# Altium footprint library Sajad_Altium_Library.PcbLib: 333 footprints (part 9 of 21)
Each footprint in its own frame and in the unit in brackets; x right, y up, seen from the top. Pads: shape width x height; smd on the part's side, far side on the other; paste and mask are expansions set on the pad; w line width, h text height; cw(c..) or ccw(c..) is an arc to the next point about the centre after c.
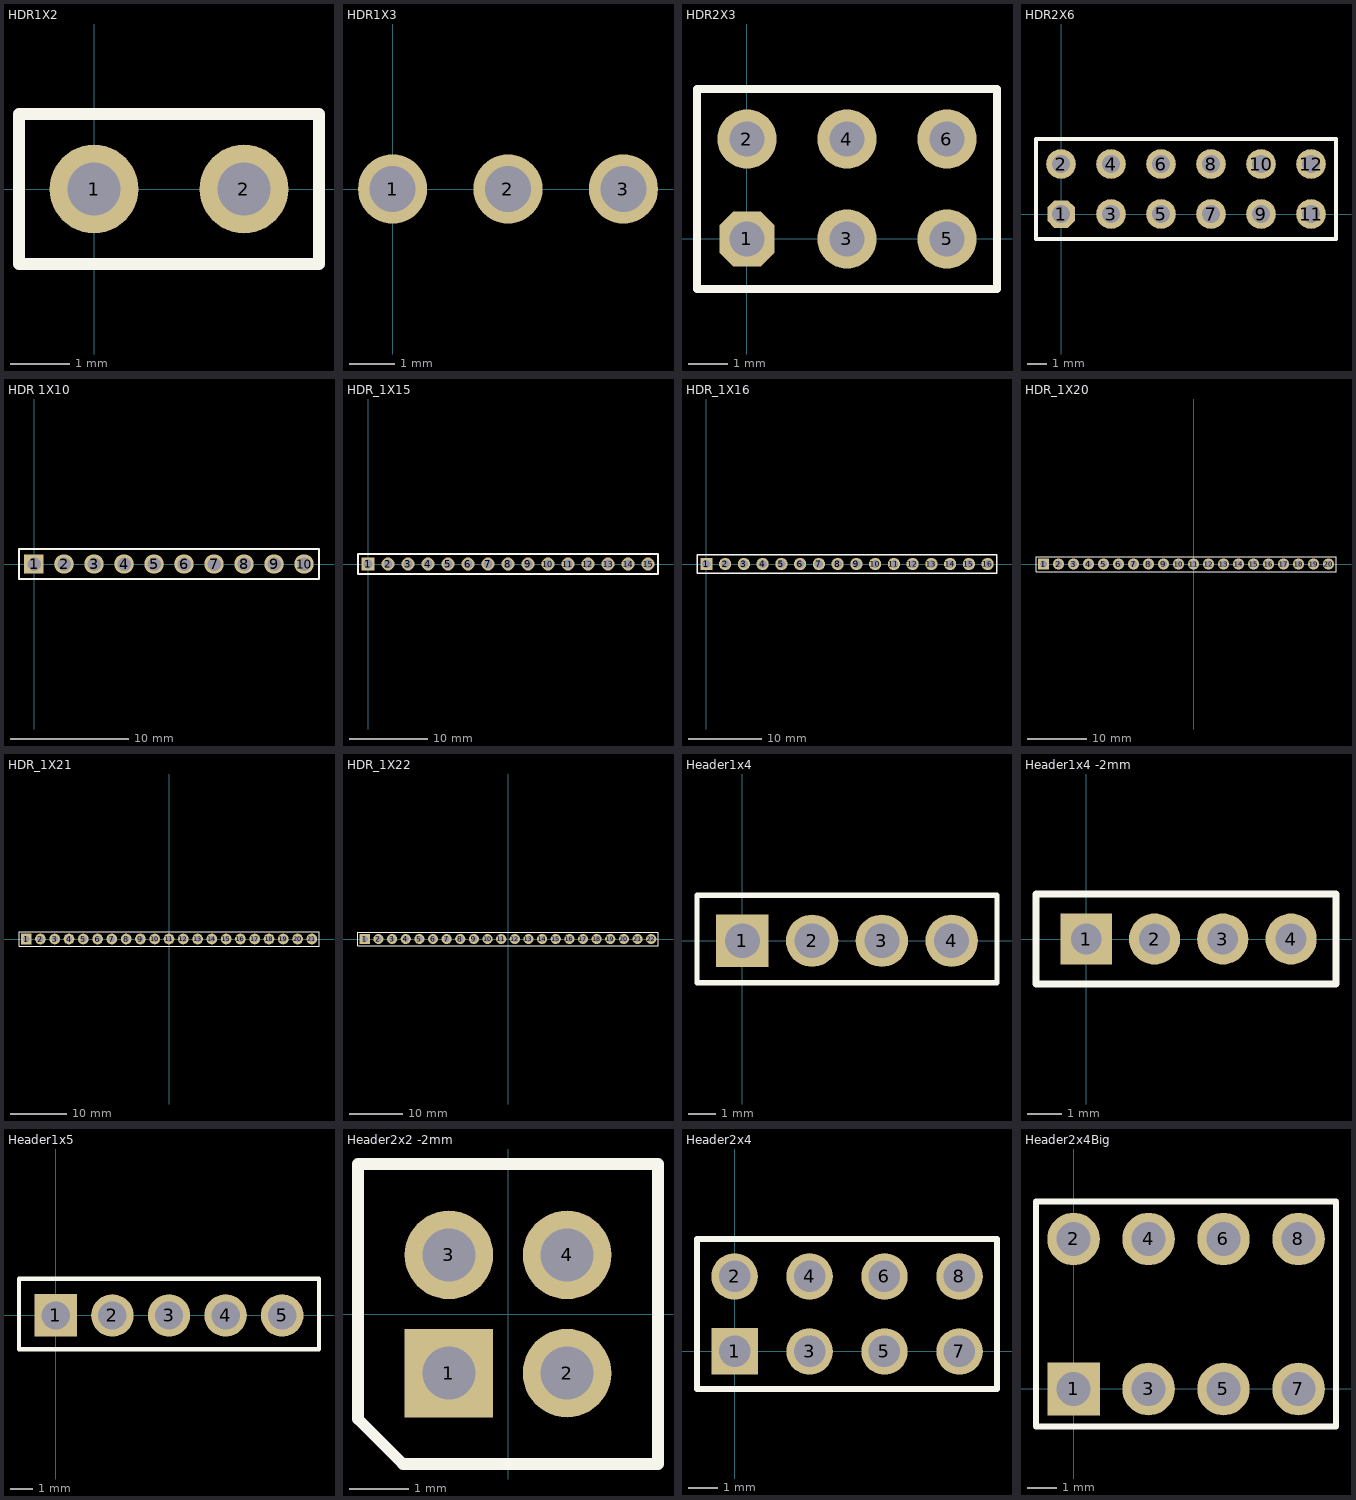
[diagram p8: the footprints below, top view; thin cyan lines are the x and y axes]

## HDR1X2 [mm] "Connector; Header; 2 Position"
pads (2):
  round 1.5 hole 0.9: 1(0,0) 2(2.54,0)
Top Overlay:
  lines w0.2: -1.27,-1.27 -1.27,1.27 3.81,1.27 3.81,-1.27 -1.27,-1.27
3D body: height 8.59, standoff -2.39, extent -1.27,-1.27 3.81,1.27

## HDR1X3 [mil] "Connector; Header; 3 Position"
pads (3):
  round 60 hole 40: 1(0,0) 2(100,0) 3(200,0)

## HDR2X3 [mm] "Connector; Header; 3x2 Position"
pads (6):
  oct 1.397x1.397 hole 0.9: 1(0,0)
  round 1.5 hole 0.9: 2(0,2.54) 3(2.54,0) 4(2.54,2.54) 5(5.08,0) 6(5.08,2.54)
Top Overlay:
  lines w0.2: -1.27,-1.27 6.35,-1.27 6.35,3.81 -1.27,3.81 -1.27,-1.27

## HDR2X6 [mm] "Connector; Header; 6x2 Position"
pads (12):
  oct 1.397x1.397 hole 0.9: 1(0,0)
  round 1.5 hole 0.9: 2(0,2.54) 3(2.54,0) 4(2.54,2.54) 5(5.08,0) 6(5.08,2.54) 7(7.62,0) 8(7.62,2.54) 9(10.16,0) 10(10.16,2.54) 11(12.7,0) 12(12.7,2.54)
Top Overlay:
  lines w0.2: -1.27,-1.27 -1.27,3.81 13.97,3.81 13.97,-1.27 -1.27,-1.27
3D body: height 8.5, standoff -3, extent -1.27,-1.27 13.97,3.81

## HDR 1X10 [mil] "Connector; Header; 10 Position"
pads (10):
  rect 65x65 hole 45: 1(0,0)
  round 65 hole 45: 2(100,0) 3(200,0) 4(300,0) 5(400,0) 6(500,0) 7(600,0) 8(700,0) 9(800,0) 10(900,0)
Top Overlay:
  lines w7.87: -50,-50 950,-50 950,50 -50,50 -50,-50

## HDR_1X15 [mil] "Connector; Header; 15 Position"
pads (15):
  rect 65x65 hole 45: 1(0,0)
  round 65 hole 45: 2(100,0) 3(200,0) 4(300,0) 5(400,0) 6(500,0) 7(600,0) 8(700,0) 9(800,0) 10(900,0) 11(1000,0) 12(1100,0) 13(1200,0) 14(1300,0) 15(1400,0)
Top Overlay:
  lines w7.87: -50,-50 -50,50 25,50 1450,50 1450,-50 -50,-50

## HDR_1X16 [mil] "Connector; Header; 16 Position"
pads (16):
  rect 65x65 hole 45: 1(0,0)
  round 65 hole 45: 2(100,0) 3(200,0) 4(300,0) 5(400,0) 6(500,0) 7(600,0) 8(700,0) 9(800,0) 10(900,0) 11(1000,0) 12(1100,0) 13(1200,0) 14(1300,0) 15(1400,0) 16(1500,0)
Top Overlay:
  lines w7.87: -50,-50 -50,50 25,50 1550,50 1550,-50 -50,-50
3D body: height 322.83, standoff -118.11, extent -45,-48.43 1551.06,50

## HDR_1X20 [mil] "Connector; Header; 20 Position"
pads (20):
  rect 75x75 hole 45: 1(-1000,0)
  round 75 hole 45: 2(-900,0) 3(-800,0) 4(-700,0) 5(-600,0) 6(-500,0) 7(-400,0) 8(-300,0) 9(-200,0) 10(-100,0) 11(0,0) 12(100,0) 13(200,0) 14(300,0) 15(400,0) 16(500,0) 17(600,0) 18(700,0) 19(800,0) 20(900,0)
Top Overlay:
  lines w7.87: 550,-50 -1050,-50 -1050,50 -975,50 550,50 ; 950,-50 950,50
  lines w8: 550,-50 950,-50 ; 550,50 950,50 550,50
3D body: height 322.83, standoff -118.11, extent -1049,-51.43 547.06,47

## HDR_1X21 [mil] "Connector; Header; 21 Position"
pads (21):
  rect 75x75 hole 45: 1(-1000,0)
  round 75 hole 45: 2(-900,0) 3(-800,0) 4(-700,0) 5(-600,0) 6(-500,0) 7(-400,0) 8(-300,0) 9(-200,0) 10(-100,0) 11(0,0) 12(100,0) 13(200,0) 14(300,0) 15(400,0) 16(500,0) 17(600,0) 18(700,0) 19(800,0) 20(900,0) 21(1000,0)
Top Overlay:
  lines w7.87: 550,-50 -1050,-50 -1050,50 -975,50 550,50 ; 1050,-50 1050,50
  lines w8: 550,-50 1050,-50 ; 550,50 1050,50 550,50
3D body: height 322.83, standoff -118.11, extent -796.06,-49.22 800,49.21

## HDR_1X22 [mil] "Connector; Header; 22 Position"
pads (22):
  rect 75x75 hole 45: 1(-1050,0)
  round 75 hole 45: 2(-950,0) 3(-850,0) 4(-750,0) 5(-650,0) 6(-550,0) 7(-450,0) 8(-350,0) 9(-250,0) 10(-150,0) 11(-50,0) 12(50,0) 13(150,0) 14(250,0) 15(350,0) 16(450,0) 17(550,0) 18(650,0) 19(750,0) 20(850,0) 21(950,0) 22(1050,0)
Top Overlay:
  lines w7.87: 500,-50 -1100,-50 -1100,50 -1025,50 500,50 ; 1100,-50 1100,50
  lines w8: 500,-50 1100,-50 ; 500,50 1100,50 500,50
3D body: height 322.83, standoff -118.11, extent -796.06,-49.21 800,49.21

## Header1x4 [mm] "Header; 4 Position"
pads (4):
  rect 1.905x1.905 hole 1.27: 1(0,0)
  round 1.905 hole 1.27: 2(2.54,0) 3(5.08,0) 4(7.62,0)
Top Overlay:
  lines w0.2: -1.651,-1.524 -1.651,1.651 9.271,1.651 9.271,-1.524 -1.651,-1.524

## Header1x4 -2mm [mm] "Header; 4 Position"
pads (4):
  rect 1.5x1.5 hole 0.9: 1(0,0)
  round 1.5 hole 0.9: 2(2,0) 3(4,0) 4(6,0)
Top Overlay:
  lines w0.2: -1.473,-1.321 -1.473,1.321 7.315,1.321 7.315,-1.321 -1.473,-1.321

## Header1x5 [mm] "Header; 5 Position"
pads (5):
  rect 1.905x1.905 hole 1.27: 1(0,0)
  round 1.905 hole 1.27: 2(2.54,0) 3(5.08,0) 4(7.62,0) 5(10.16,0)
Top Overlay:
  lines w0.2: -1.651,-1.524 -1.651,1.651 11.811,1.651 11.811,-1.524 -1.651,-1.524

## Header2x2 -2mm [mm] "Header; 4 Position"
pads (4):
  rect 1.5x1.5 hole 0.9: 1(-1,-1)
  round 1.5 hole 0.9: 2(1,-1) 3(-1,1) 4(1,1)
Top Overlay:
  lines w0.2: -2.54,-1.778 -2.54,2.54 2.54,2.54 2.54,-2.54 -1.778,-2.54 -2.54,-1.778

## Header2x4 [mil]
pads (8):
  rect 62x62 hole 42: 1(0,0)
  round 62 hole 42: 2(0,100) 3(100,0) 4(100,100) 5(200,0) 6(200,100) 7(300,0) 8(300,100)
Top Overlay:
  lines w7.87: -50,-50 350,-50 350,150 -50,150 -50,-50

## Header2x4Big [mil]
pads (8):
  rect 70x70 hole 45: 1(0,0)
  round 70 hole 45: 2(0,200) 3(100,0) 4(100,200) 5(200,0) 6(200,200) 7(300,0) 8(300,200)
Top Overlay:
  lines w7.87: -50,-50 -50,250 350,250 350,-50 -50,-50